# Altium footprint library JL_PCB.PCBLIB: 1112 footprints (part 2 of 71)
Each footprint in its own frame and in the unit in brackets; x right, y up, seen from the top. Pads: shape width x height; smd on the part's side, far side on the other; paste and mask are expansions set on the pad; w line width, h text height; cw(c..) or ccw(c..) is an arc to the next point about the centre after c.
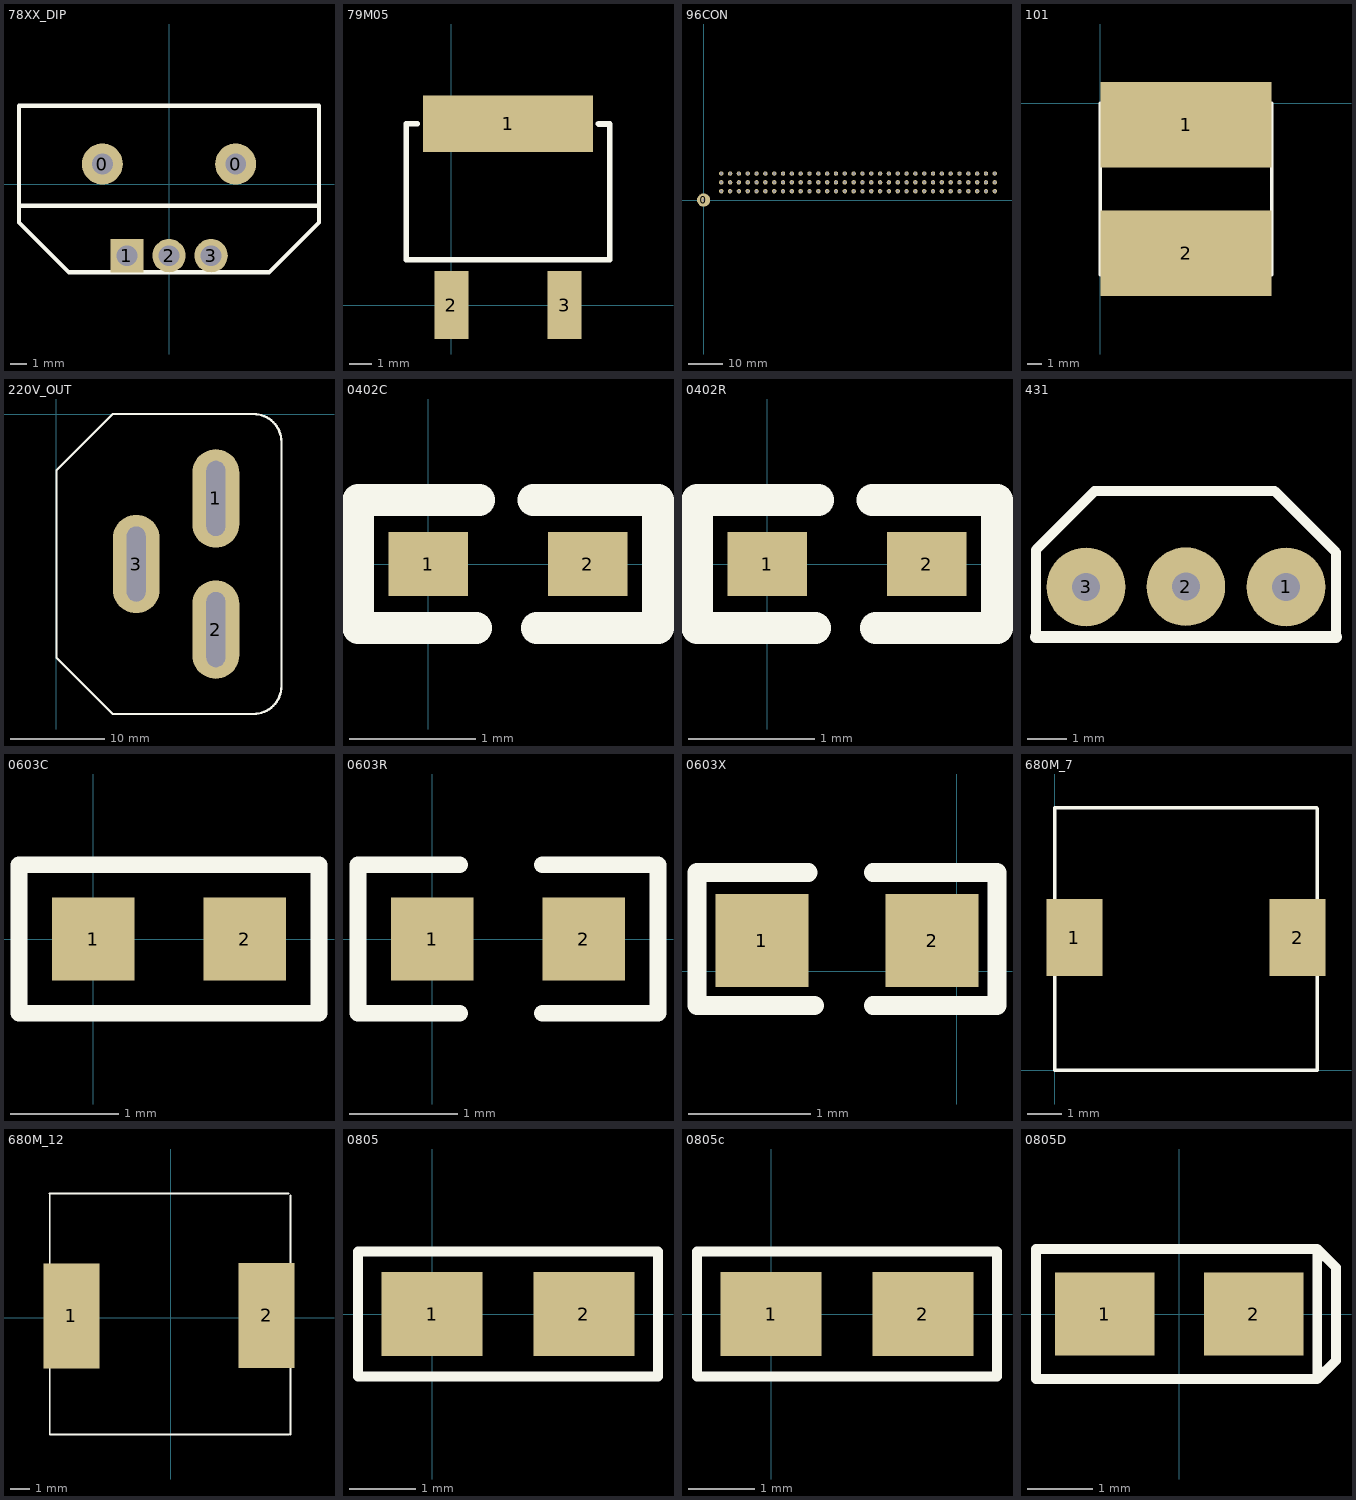
[diagram p1: the footprints below, top view; thin cyan lines are the x and y axes]

## 78XX_DIP [mil]
pads (5):
  round 98.42 hole 50: 0(-160,48) 0(160,48)
  rect 80x80 hole 50: 1(-101,-172)
  round 80 hole 50: 2(0,-172) 3(101,-172)
TopOverlay:
  lines w10: -360,-52 360,-52 ; -360,-92 -240,-212 240,-212 360,-92 360,188 -360,188 -360,-92
3D body "User Library-TO-220 Con Disipador 34M8491.STEP": height 1159.52, standoff -245.89, extent -607.83,-592.94 600.33,597.25

## 79M05 [mil]
pads (3):
  rect 300x100 smd: 1(100,320)
  rect 60x120 smd: 2(0,0) 3(200,0)
TopOverlay:
  lines w10: -60.16,320.16 -80,320.16 ; 260,320 260.16,319.84 280,319.84 280,80 -80,80 ; -80,80 -80,320.16 ; -80,80 -80,320.16

## 96CON [mil]
pads (97):
  round 150 hole 30: 0(0,0)
  round 50 hole 30: 1(3300,300) 2(3200,300) 3(3100,300) 4(3000,300) 5(2900,300) 6(2800,300) 7(2700,300) 8(2600,300) 9(2500,300) 10(2400,300) 11(2300,300) 12(2200,300) 13(2100,300) 14(2000,300) 15(1900,300) 16(1800,300) 17(1700,300) 18(1600,300) 19(1500,300) 20(1400,300) 21(1300,300) 22(1200,300) 23(1100,300) 24(1000,300) 25(900,300) 26(800,300) 27(700,300) 28(600,300) 29(500,300) 30(400,300) 31(300,300) 32(200,300) 33(3300,200) 34(3200,200) 35(3100,200) 36(3000,200) 37(2900,200) 38(2800,200) 39(2700,200) 40(2600,200) 41(2500,200) 42(2400,200) 43(2300,200) 44(2200,200) 45(2100,200) 46(2000,200) 47(1900,200) 48(1800,200) 49(1700,200) 50(1600,200) 51(1500,200) 52(1400,200) 53(1300,200) 54(1200,200) 55(1100,200) 56(1000,200) 57(900,200) 58(800,200) 59(700,200) 60(600,200) 61(500,200) 62(400,200) 63(300,200) 64(200,200) 65(3300,100) 66(3200,100) 67(3100,100) 68(3000,100) 69(2900,100) 70(2800,100) 71(2700,100) 72(2600,100) 73(2500,100) 74(2400,100) 75(2300,100) 76(2200,100) 77(2100,100) 78(2000,100) 79(1900,100) 80(1800,100) 81(1700,100) 82(1600,100) 83(1500,100) 84(1400,100) 85(1300,100) 86(1200,100) 87(1100,100) 88(1000,100) 89(900,100) 90(800,100) 91(700,100) 92(600,100) 93(500,100) 94(400,100) 95(300,100) 96(200,100)

## 101 [mm]
pads (2):
  rect 12x6 smd: 1(6,-1.5) 2(6,-10.5)
TopOverlay:
  lines w0.254: 0,-12 0,0 12,0 12,-12 0,-12

## 220V_OUT [mm]
pads (3):
  oval 5x10.5 hole 2 slot 8 at 90 deg: 1(17,-9) 2(17,-23) 3(8.5,-16)
TopOverlay:
  lines w0.254: 0,-26 6,-32 21,-32 ccw(c21,-29) 24,-29 24,-3 ccw(c21,-3) 21,0 6.706,0 6,0 0,-6 0,-26

## 0402C [mil]
pads (2):
  rect 25x20 smd: 1(0,0) 2(50,0)
TopOverlay:
  lines w10: 15,-20 -22,-20 -22,20 16,20 ; 33,20 72,20 72,-20 34,-20
3D body "SW3dPS-0402 SMD Capacitor.STEP": height 8.55, standoff 0.6, extent 4.31,-12 43.69,11.62

## 0402R [mil]
pads (2):
  rect 25x20 smd: 1(0,0) 2(50,0)
TopOverlay:
  lines w10: 15,-20 -22,-20 -22,20 16,20 ; 33,20 72,20 72,-20 34,-20
3D body "User Library-res0402-1.STEP": height 11.81, standoff 0, extent 4.31,-9.85 43.68,9.84

## 431 [mm]
pads (3):
  round 2 hole 0.711: 1(39.402,-63.902) 2(36.858,-63.896) 3(34.322,-63.902)
TopOverlay:
  lines w0.254: 33.052,-65.172 33.052,-62.96 34.544,-61.468 39.116,-61.468 40.672,-63.024 40.672,-65.172
  lines w0.305: 33.052,-65.172 40.672,-65.172
3D body "TO-92_Bent.STEP": height 12.39, standoff -6.6, extent 27.679,-71.166 45.441,-55.701

## 0603C [mil]
pads (2):
  rect 30x30 smd: 1(0,0) 2(55,0)
TopOverlay:
  lines w6: 81,27 -27,27 -27,-27 82,-27 82,27
3D body "User Library-0603 SMD Capacitor.step": height 12.49, standoff 0.6, extent -4.49,-15.75 58.51,15.75

## 0603R [mil]
pads (2):
  rect 30x30 smd: 1(0,0) 2(55,0)
TopOverlay:
  lines w6: 10,-27 -27,-27 -27,27 10,27 ; 40,-27 82,-27 82,27 40,27
3D body "User Library-RESC1608X05N.step": height 17.76, standoff 0, extent -3.51,-17.73 57.51,15.73

## 0603X [mil]
pads (2):
  rect 30x30 smd: 1(-63,10) 2(-8,10)
TopOverlay:
  lines w6: -48,32 -84,32 -84,-11 -46,-11 ; -27,-11 13,-11 13,32 -27,32
3D body "User Library-res0603-1.step": height 15.75, standoff 0, extent -66.49,-6.74 -3.5,24.75

## 680M_7 [mm]
height 4
pads (2):
  rect 1.6x2.2 smd: 1(0.559,3.801) 2(6.959,3.801)
TopOverlay:
  lines w0.1: 0,7.5 0,0 7.5,0 ; 0,7.518 7.5,7.518 ; 7.518,0 7.518,7.5

## 680M_12 [mil]
height 196.85
pads (2):
  rect 114.17x212.6 smd: 1(-201,4) 2(194,5)
TopOverlay:
  lines w3.94: -245.25,252 239,252 ; -245,-236 239.25,-236 ; -245,-234 -245,250.25 ; 243,-236 243,248.25
3D body "User Library-SDR0805.step": height 199.42, standoff 0.6, extent -146.75,-146.64 142.76,148.64

## 0805 [mil]
pads (2):
  rect 60x50 smd: 1(0,0) 2(90,0)
TopOverlay:
  lines w6: -44,-37 134,-37 134,37 -44,37 -44,-37
3D body "User Library-0805 SMD Capacitor.step": height 31.39, standoff 0.6, extent 4.64,-24.6 83.38,24.61

## 0805c [mil]
pads (2):
  rect 60x50 smd: 1(0,0) 2(90,0)
TopOverlay:
  lines w6: -44,-37 134,-37 134,37 -44,37 -44,-37
3D body "User Library-0805 SMD Capacitor.step": height 31.39, standoff 0.6, extent 4.64,-24.6 83.38,24.61

## 0805D [mil]
pads (2):
  rect 60x50 smd: 1(-45,0) 2(45,0)
TopOverlay:
  lines w6: 83.33,-39.37 94.69,-28.02 94.69,28.02 83.33,39.37 ; 83.33,-39.37 83.33,39.37 ; 83.33,-39.37 -86.61,-39.37 -86.61,39.37 83.33,39.37
3D body "CircuitWorks-LED 1206.STEP": height 41.94, standoff -1.36, extent -62.99,-32.49 62.99,30.5